# Altium footprint library altium_parts_templates_PCB.PcbLib: 93 footprints (part 3 of 6)
Each footprint in its own frame and in the unit in brackets; x right, y up, seen from the top. Pads: shape width x height; smd on the part's side, far side on the other; paste and mask are expansions set on the pad; w line width, h text height; cw(c..) or ccw(c..) is an arc to the next point about the centre after c.
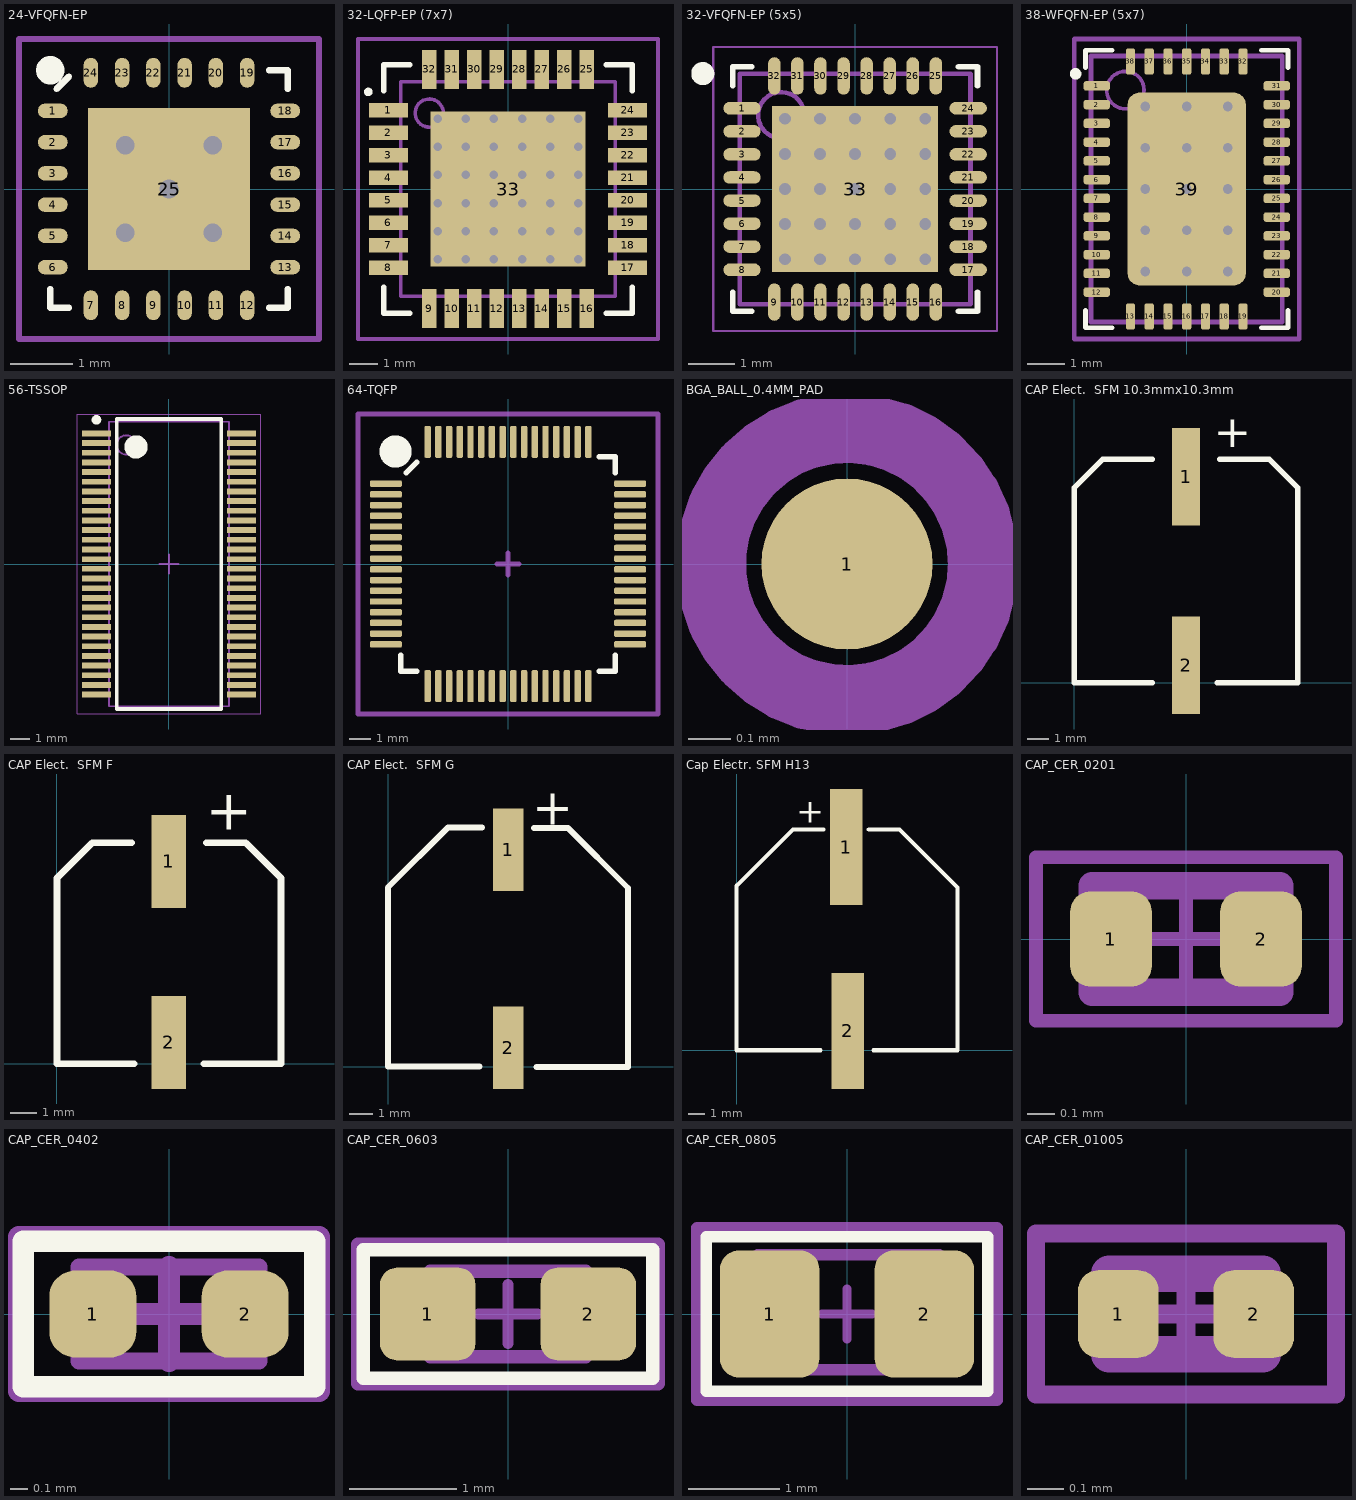
[diagram p2: the footprints below, top view; thin cyan lines are the x and y axes]

## 24-VFQFN-EP [mm] "24-VFQFN-EP"
pads (25):
  oval 0.48x0.23 smd: 1(-1.86,1.25) 2(-1.86,0.75) 3(-1.86,0.25) 4(-1.86,-0.25) 5(-1.86,-0.75) 6(-1.86,-1.25) 13(1.86,-1.25) 14(1.86,-0.75) 15(1.86,-0.25) 16(1.86,0.25) 17(1.86,0.75) 18(1.86,1.25)
  oval 0.23x0.48 smd: 7(-1.25,-1.86) 8(-0.75,-1.86) 9(-0.25,-1.86) 10(0.25,-1.86) 11(0.75,-1.86) 12(1.25,-1.86) 19(1.25,1.86) 20(0.75,1.86) 21(0.25,1.86) 22(-0.25,1.86) 23(-0.75,1.86) 24(-1.25,1.86)
  rect 2.6x2.6 smd: 25(0,0)
via 0,0 diameter 0.6 hole 0.3
via -0.7,0.7 diameter 0.6 hole 0.3
via -0.7,-0.7 diameter 0.6 hole 0.3
via 0.7,-0.7 diameter 0.6 hole 0.3
via 0.7,0.7 diameter 0.6 hole 0.3
Top Overlay:
  circle w0.254: c-1.9,1.9 r0.1
  lines w0.102: -1.9,-1.6 -1.9,-1.9 -1.6,-1.9 ; -1.8,1.6 -1.6,1.8 ; 1.6,-1.9 1.9,-1.9 1.9,-1.6 ; 1.6,1.9 1.9,1.9 1.9,1.6
Top Courtyard:
  lines w0.102: -0.3,0 0.3,0 ; 0,-0.3 0,0.3 ; -2.4,-2.4 2.4,-2.4 2.4,2.4 -2.4,2.4 -2.4,-2.4

## 32-LQFP-EP (7x7) [mm] "32-LQFP-EP, 32-HLQFP (7x7)"
height 2.45
pads (33):
  rect 1.4x0.5 smd paste-0.025 mask+0.07: 1(-4.25,2.8) 2(-4.25,2) 3(-4.25,1.2) 4(-4.25,0.4) 5(-4.25,-0.4) 6(-4.25,-1.2) 7(-4.25,-2) 8(-4.25,-2.8) 17(4.25,-2.8) 18(4.25,-2) 19(4.25,-1.2) 20(4.25,-0.4) 21(4.25,0.4) 22(4.25,1.2) 23(4.25,2) 24(4.25,2.8)
  rect 0.5x1.4 smd paste-0.025 mask+0.07: 9(-2.8,-4.25) 10(-2,-4.25) 11(-1.2,-4.25) 12(-0.4,-4.25) 13(0.4,-4.25) 14(1.2,-4.25) 15(2,-4.25) 16(2.8,-4.25) 25(2.8,4.25) 26(2,4.25) 27(1.2,4.25) 28(0.4,4.25) 29(-0.4,4.25) 30(-1.2,4.25) 31(-2,4.25) 32(-2.8,4.25)
  rect 5.5x5.5 smd paste-0.795 mask-0.795: 33(0,0)
via -2.5,-2.5 diameter 0.5 hole 0.3
via -1.5,-2.5 diameter 0.5 hole 0.3
via -0.5,-2.5 diameter 0.5 hole 0.3
via 0.5,-2.5 diameter 0.5 hole 0.3
via 1.5,-2.5 diameter 0.5 hole 0.3
via 2.5,-2.5 diameter 0.5 hole 0.3
via -2.5,-1.5 diameter 0.5 hole 0.3
via -1.5,-1.5 diameter 0.5 hole 0.3
via -0.5,-1.5 diameter 0.5 hole 0.3
via 0.5,-1.5 diameter 0.5 hole 0.3
via 1.5,-1.5 diameter 0.5 hole 0.3
via 2.5,-1.5 diameter 0.5 hole 0.3
via -2.5,-0.5 diameter 0.5 hole 0.3
via -1.5,-0.5 diameter 0.5 hole 0.3
via -0.5,-0.5 diameter 0.5 hole 0.3
via 0.5,-0.5 diameter 0.5 hole 0.3
via 1.5,-0.5 diameter 0.5 hole 0.3
via 2.5,-0.5 diameter 0.5 hole 0.3
via -2.5,0.5 diameter 0.5 hole 0.3
via -1.5,0.5 diameter 0.5 hole 0.3
via -0.5,0.5 diameter 0.5 hole 0.3
via 0.5,0.5 diameter 0.5 hole 0.3
via 1.5,0.5 diameter 0.5 hole 0.3
via 2.5,0.5 diameter 0.5 hole 0.3
via -2.5,1.5 diameter 0.5 hole 0.3
via -1.5,1.5 diameter 0.5 hole 0.3
via -0.5,1.5 diameter 0.5 hole 0.3
via 0.5,1.5 diameter 0.5 hole 0.3
via 1.5,1.5 diameter 0.5 hole 0.3
via 2.5,1.5 diameter 0.5 hole 0.3
via 2.5,2.5 diameter 0.5 hole 0.3
via 1.5,2.5 diameter 0.5 hole 0.3
via 0.5,2.5 diameter 0.5 hole 0.3
via -0.5,2.5 diameter 0.5 hole 0.3
via -1.5,2.5 diameter 0.5 hole 0.3
via -2.5,2.5 diameter 0.5 hole 0.3
Top Overlay:
  circle w0.152: c-4.969,3.452 r0.076
  lines w0.2: -4.417,-3.492 -4.417,-4.417 -3.492,-4.417 ; -4.417,3.492 -4.417,4.417 -3.492,4.417 ; 3.492,-4.417 4.417,-4.417 4.417,-3.492 ; 3.492,4.417 4.392,4.417 ; 4.417,3.492 4.417,4.417
Top Assembly Drawing:
  circle w0.127: c-2.8,2.7 r0.5
  lines w0.127: -3.81,-3.81 -3.81,3.81 3.81,3.81 3.81,-3.81 -3.81,-3.81
Top Courtyard:
  lines w0.127: -1.27,0 1.27,0 ; 0,-1.27 0,1.27 ; -5.334,-5.334 -5.334,5.334 5.334,5.334 5.334,-5.334 -5.334,-5.334
3D body: height 2.45, standoff 0, extent -3.81,-3.81 3.81,3.81

## 32-VFQFN-EP (5x5) [mm] "32-VFQFN-EP, 32-QFN (5x5)"
height 0.9
pads (33):
  oval 0.81x0.27 smd paste-0.025 mask+0.05: 1(-2.45,1.75) 2(-2.45,1.25) 3(-2.45,0.75) 4(-2.45,0.25) 5(-2.45,-0.25) 6(-2.45,-0.75) 7(-2.45,-1.25) 8(-2.45,-1.75) 17(2.45,-1.75) 18(2.45,-1.25) 19(2.45,-0.75) 20(2.45,-0.25) 21(2.45,0.25) 22(2.45,0.75) 23(2.45,1.25) 24(2.45,1.75)
  oval 0.27x0.81 smd paste-0.025 mask+0.05: 9(-1.75,-2.45) 10(-1.25,-2.45) 11(-0.75,-2.45) 12(-0.25,-2.45) 13(0.25,-2.45) 14(0.75,-2.45) 15(1.25,-2.45) 16(1.75,-2.45) 25(1.75,2.45) 26(1.25,2.45) 27(0.75,2.45) 28(0.25,2.45) 29(-0.25,2.45) 30(-0.75,2.45) 31(-1.25,2.45) 32(-1.75,2.45)
  rect 3.6x3.6 smd paste-5 mask+0.05: 33(0,0)
via -1.52,1.52 diameter 0.5 hole 0.254
via -0.76,1.52 diameter 0.5 hole 0.254
via 0,1.52 diameter 0.5 hole 0.254
via 0.76,1.52 diameter 0.5 hole 0.254
via 1.52,1.52 diameter 0.5 hole 0.254
via 1.52,0.76 diameter 0.5 hole 0.254
via 0.76,0.76 diameter 0.5 hole 0.254
via 0,0.76 diameter 0.5 hole 0.254
via -0.76,0.76 diameter 0.5 hole 0.254
via -1.52,0.76 diameter 0.5 hole 0.254
via 1.52,0 diameter 0.5 hole 0.254
via 0.76,0 diameter 0.5 hole 0.254
via 0,0 diameter 0.5 hole 0.254
via -0.76,0 diameter 0.5 hole 0.254
via -1.52,0 diameter 0.5 hole 0.254
via 1.52,-0.76 diameter 0.5 hole 0.254
via 0.76,-0.76 diameter 0.5 hole 0.254
via 0,-0.76 diameter 0.5 hole 0.254
via -0.76,-0.76 diameter 0.5 hole 0.254
via -1.52,-0.76 diameter 0.5 hole 0.254
via 1.52,-1.52 diameter 0.5 hole 0.254
via 0.76,-1.52 diameter 0.5 hole 0.254
via 0,-1.52 diameter 0.5 hole 0.254
via -0.76,-1.52 diameter 0.5 hole 0.254
via -1.52,-1.52 diameter 0.5 hole 0.254
Top Overlay:
  circle w0.25: c-3.3,2.5 r0.125
  lines w0.127: -2.65,-2.238 -2.65,-2.65 -2.238,-2.65 ; -2.65,2.238 -2.65,2.65 -2.238,2.65 ; 2.238,-2.65 2.65,-2.65 2.65,-2.238 ; 2.238,2.65 2.65,2.65 2.65,2.238
Top Paste:
  region: 0,0
  region: 0.2,-0.2 0.2,-1.8 1.8,-1.8 1.8,-0.2
  region: -1.8,-0.2 -1.8,-1.8 -0.2,-1.8 -0.2,-0.2
  region: -1.8,1.8 -1.8,0.2 -0.2,0.2 -0.2,1.8
  region: 0.2,1.8 0.2,0.2 1.8,0.2 1.8,1.8
Top Assembly Drawing:
  circle w0.1: c-1.6,1.6 r0.5
  lines w0.1: -2.5,-2.5 -2.5,2.5 2.5,2.5 2.5,-2.5 -2.5,-2.5
Top Courtyard:
  lines w0.05: -3.075,-3.075 -3.075,3.075 3.075,3.075 3.075,-3.075 -3.075,-3.075
  lines w0.1: -0.5,0 0.5,0 ; 0,-0.5 0,0.5
3D body "QFN127P600-8N.step": height 0.9, standoff 0, extent -2.53,-2.53 2.53,2.53

## 38-WFQFN-EP (5x7) [mm] "38-WFQFN-EP, 38-QFN (5x7)"
height 0.8
pads (39):
  rrect50% 0.7x0.25 smd paste+0 mask+0.05: 1(-2.4,2.75) 2(-2.4,2.25) 3(-2.4,1.75) 4(-2.4,1.25) 5(-2.4,0.75) 6(-2.4,0.25) 7(-2.4,-0.25) 8(-2.4,-0.75) 9(-2.4,-1.25) 10(-2.4,-1.75) 11(-2.4,-2.25) 12(-2.4,-2.75) 20(2.4,-2.75) 21(2.4,-2.25) 22(2.4,-1.75) 23(2.4,-1.25) 24(2.4,-0.75) 25(2.4,-0.25) 26(2.4,0.25) 27(2.4,0.75) 28(2.4,1.25) 29(2.4,1.75) 30(2.4,2.25) 31(2.4,2.75)
  rrect50% 0.25x0.7 smd paste+0 mask+0.05: 13(-1.5,-3.4) 14(-1,-3.4) 15(-0.5,-3.4) 16(0,-3.4) 17(0.5,-3.4) 18(1,-3.4) 19(1.5,-3.4) 32(1.5,3.4) 33(1,3.4) 34(0.5,3.4) 35(0,3.4) 36(-0.5,3.4) 37(-1,3.4) 38(-1.5,3.4)
  rrect20% 3.15x5.15 smd paste-10 mask+0.05: 39(0,0)
via 1.1,-2.2 diameter 0.508 hole 0.254
via 0,-2.2 diameter 0.508 hole 0.254
via -1.1,-2.2 diameter 0.508 hole 0.254
via 1.1,-1.1 diameter 0.508 hole 0.254
via 0,-1.1 diameter 0.508 hole 0.254
via -1.1,-1.1 diameter 0.508 hole 0.254
via 1.1,0 diameter 0.508 hole 0.254
via 0,0 diameter 0.508 hole 0.254
via -1.1,0 diameter 0.508 hole 0.254
via 1.1,1.1 diameter 0.508 hole 0.254
via 0,1.1 diameter 0.508 hole 0.254
via -1.1,1.1 diameter 0.508 hole 0.254
via 1.1,2.2 diameter 0.508 hole 0.254
via 0,2.2 diameter 0.508 hole 0.254
via -1.1,2.2 diameter 0.508 hole 0.254
Top Overlay:
  circle w0.152: c-2.963,3.071 r0.076
  lines w0.127: -2.7,-3.238 -2.7,-3.7 -1.988,-3.7 ; -2.7,3.238 -2.7,3.7 -1.988,3.7 ; 1.988,-3.7 2.7,-3.7 2.7,-3.238 ; 1.988,3.7 2.7,3.7 2.7,3.238
Top Paste:
  rectangle: -0.5,1.7 0.5,2.5
  rectangle: -0.5,0.6 0.5,1.6
  rectangle: -1.5,0.6 -0.6,1.6
  rectangle: -1.5,-0.5 -0.6,0.5
  rectangle: -1.5,-1.6 -0.6,-0.6
  rectangle: -0.5,-2.5 0.5,-1.7
  rectangle: -0.5,-0.5 0.5,0.5
  rectangle: -0.5,-1.6 0.5,-0.6
  region: 1.5,-0.6 0.6,-0.6 0.6,-1.6 1.5,-1.6
  region: 1.5,0.5 0.6,0.5 0.6,-0.5 1.5,-0.5
  region: 1.5,1.6 0.6,1.6 0.6,0.6 1.5,0.6
  region: -1.5,2.2 -1.5,2.26 -1.454,2.37 -1.37,2.454 -1.26,2.5 -1.2,2.5 -0.6,2.5 -0.6,1.7 -1.5,1.7
  region: 1.5,2.2 1.5,2.26 1.454,2.37 1.37,2.454 1.26,2.5 1.2,2.5 0.6,2.5 0.6,1.7 1.5,1.7
  region: 1.5,-2.2 1.5,-2.26 1.454,-2.37 1.37,-2.454 1.26,-2.5 1.2,-2.5 0.6,-2.5 0.6,-1.7 1.5,-1.7
  region: -1.5,-2.2 -1.5,-2.26 -1.454,-2.37 -1.37,-2.454 -1.26,-2.5 -1.2,-2.5 -0.6,-2.5 -0.6,-1.7 -1.5,-1.7
Top Assembly Drawing:
  circle w0.1: c-1.636,2.636 r0.5
  lines w0.127: -2.55,-3.55 2.55,-3.55 2.55,3.55 -2.55,3.55 -2.55,-3.55
Top Courtyard:
  lines w0.127: -0.5,0 0.5,0 ; 0,-0.5 0,0.5 ; -3,-4 3,-4 3,4 -3,4 -3,-4
3D body "ADC_LTC2499CUHF.step": height 0.8, standoff 0, extent -2.551,-3.551 2.551,3.551

## 56-TSSOP [mm] "56-TSSOP"
pads (56):
  rect 1.5x0.3 smd paste-0.025 mask+0.05: 1(-3.75,6.75) 2(-3.75,6.25) 3(-3.75,5.75) 4(-3.75,5.25) 5(-3.75,4.75) 6(-3.75,4.25) 7(-3.75,3.75) 8(-3.75,3.25) 9(-3.75,2.75) 10(-3.75,2.25) 11(-3.75,1.75) 12(-3.75,1.25) 13(-3.75,0.75) 14(-3.75,0.25) 15(-3.75,-0.25) 16(-3.75,-0.75) 17(-3.75,-1.25) 18(-3.75,-1.75) 19(-3.75,-2.25) 20(-3.75,-2.75) 21(-3.75,-3.25) 22(-3.75,-3.75) 23(-3.75,-4.25) 24(-3.75,-4.75) 25(-3.75,-5.25) 26(-3.75,-5.75) 27(-3.75,-6.25) 28(-3.75,-6.75) 29(3.75,-6.75) 30(3.75,-6.25) 31(3.75,-5.75) 32(3.75,-5.25) 33(3.75,-4.75) 34(3.75,-4.25) 35(3.75,-3.75) 36(3.75,-3.25) 37(3.75,-2.75) 38(3.75,-2.25) 39(3.75,-1.75) 40(3.75,-1.25) 41(3.75,-0.75) 42(3.75,-0.25) 43(3.75,0.25) 44(3.75,0.75) 45(3.75,1.25) 46(3.75,1.75) 47(3.75,2.25) 48(3.75,2.75) 49(3.75,3.25) 50(3.75,3.75) 51(3.75,4.25) 52(3.75,4.75) 53(3.75,5.25) 54(3.75,5.75) 55(3.75,6.25) 56(3.75,6.75)
Top Overlay:
  circle w0.25: c-3.75,7.45 r0.125
  circle w0.6: c-1.7,6.05 r0.3
  lines w0.2: -2.7,-7.5 -2.7,7.5 2.7,7.5 2.7,-7.5 -2.7,-7.5
Top Assembly Drawing:
  circle w0.1: c-2.2,6.15 r0.5
  lines w0.1: -3.1,-7.35 3.1,-7.35 3.1,7.35 -3.1,7.35 -3.1,-7.35
Top Courtyard:
  lines w0.05: -4.75,-7.75 -4.75,7.75 4.75,7.75 4.75,-7.75 -4.75,-7.75
  lines w0.1: -0.5,0 0.5,0 ; 0,-0.5 0,0.5
3D body: height 1.2, standoff 0.05, extent -3.1,-7.05 3.1,7.05

## 64-TQFP [mm] "65-TQFP"
pads (64):
  rrect50% 1.5x0.3 smd: 1(-5.7,3.75) 2(-5.7,3.25) 3(-5.7,2.75) 4(-5.7,2.25) 5(-5.7,1.75) 6(-5.7,1.25) 7(-5.7,0.75) 8(-5.7,0.25) 9(-5.7,-0.25) 10(-5.7,-0.75) 11(-5.7,-1.25) 12(-5.7,-1.75) 13(-5.7,-2.25) 14(-5.7,-2.75) 15(-5.7,-3.25) 16(-5.7,-3.75) 33(5.7,-3.75) 34(5.7,-3.25) 35(5.7,-2.75) 36(5.7,-2.25) 37(5.7,-1.75) 38(5.7,-1.25) 39(5.7,-0.75) 40(5.7,-0.25) 41(5.7,0.25) 42(5.7,0.75) 43(5.7,1.25) 44(5.7,1.75) 45(5.7,2.25) 46(5.7,2.75) 47(5.7,3.25) 48(5.7,3.75)
  rrect50% 0.3x1.5 smd: 17(-3.75,-5.7) 18(-3.25,-5.7) 19(-2.75,-5.7) 20(-2.25,-5.7) 21(-1.75,-5.7) 22(-1.25,-5.7) 23(-0.75,-5.7) 24(-0.25,-5.7) 25(0.25,-5.7) 26(0.75,-5.7) 27(1.25,-5.7) 28(1.75,-5.7) 29(2.25,-5.7) 30(2.75,-5.7) 31(3.25,-5.7) 32(3.75,-5.7) 49(3.75,5.7) 50(3.25,5.7) 51(2.75,5.7) 52(2.25,5.7) 53(1.75,5.7) 54(1.25,5.7) 55(0.75,5.7) 56(0.25,5.7) 57(-0.25,5.7) 58(-0.75,5.7) 59(-1.25,5.7) 60(-1.75,5.7) 61(-2.25,5.7) 62(-2.75,5.7) 63(-3.25,5.7) 64(-3.75,5.7)
Top Overlay:
  circle w1: c-5.25,5.25 r0.25
  lines w0.254: -5,-4.25 -5,-5 -4.25,-5 ; -4.75,4.25 -4.25,4.75 ; 4.25,-5 5,-5 5,-4.25 ; 4.25,5 5,5 5,4.25
Top Courtyard:
  lines w0.254: -0.5,0 0.5,0 ; 0,-0.5 0,0.5 ; -7,-7 -7,7 7,7 7,-7 -7,-7

## BGA_BALL_0.4MM_PAD [mm]
pads (1):
  round 0.4 smd mask+0.05: 1(0,0)
Top Assembly Drawing:
  circle w0.127: c0,0 r0.3
Top Courtyard:
  circle w0.1: c0,0 r0.351
  lines w0.127: -0.125,0 0.125,0 ; 0,-0.125 0,0.125
3D body: height 0.5, standoff -0.1, extent -0.3,-0.298 0.3,0.298

## CAP Elect.  SFM 10.3mmx10.3mm [mm]
height 10.2
pads (2):
  rect 1.3x4.5 smd: 1(5.15,9.5) 2(5.15,0.8)
Top Overlay:
  lines w0.254: 3.6,0 0,0 0,9 1.3,10.3 3.6,10.3 ; 6.6,0 10.3,0 10.3,9 9,10.3 6.7,10.3
  text "+" at 6.425,10.875 h1.52
3D body: height 3.5, standoff 0, extent 0,0 10.3,10.3
3D body: height 13.7, standoff 3.5, extent 0.15,0.15 10.111,10.13

## CAP Elect.  SFM F [mm]
height 10.49
pads (2):
  rect 1.3x3.5 smd: 1(4.2,7.6) 2(4.2,0.8)
Top Overlay:
  lines w0.254: 2.8,8.3 1.325,8.3 0,6.975 0,0 2.9,0 ; 5.525,0 8.425,0 8.425,6.975 7.1,8.3 5.625,8.3
  text "+" at 5.6,8.8 h1.52
3D body "User Library-AL_EL_cap_8mmx10mm.STEP": height 10.5, standoff 0, extent -0.075,-0.675 8.425,9.025

## CAP Elect.  SFM G [mm]
height 12.2
pads (2):
  rect 1.3x3.5 smd: 1(5.1,9.2) 2(5.1,0.8)
Top Overlay:
  lines w0.254: 3.875,0 0,0 0,7.6 2.55,10.15 3.975,10.15 ; 6.2,10.125 7.625,10.125 10.175,7.575 10.175,-0.025 6.3,-0.025
  text "+" at 6.125,10.25 h1.52
3D body "SW3dPS-APXA4R0ARA122MJC2G CAP United Chemi-Con.STEP": height 11.94, standoff 0.09, extent 0,0 10.16,10.16

## Cap Electr. SFM H13 [mm] "Panasonic H13 SFM Cap Package"
height 0.9
pads (2):
  rect 2x7.2 smd: 1(6.8,12.6) 2(6.9,1.2)
Top Overlay:
  lines w0.254: 5.2,0 0,0 0,10.2 3.5,13.7 5.4,13.7 ; 8.2,13.7 10.1,13.7 13.7,10.1 13.7,0 8.5,0
  text "+" at 3.7,14.1 h1.52
3D body: height 2, standoff 0, extent 0,0 13.7,13.7
3D body: height 16.5, standoff 2, extent 0.451,0.4 13.4,13.374

## CAP_CER_0201 [mm] "Chip Capacitor, 2-Leads, Body 0,60x0,30mm, IPC Medium Density"
height 0.39
pads (2):
  rrect50% 0.3x0.35 smd paste+0 mask+0.02: 1(-0.275,0) 2(0.275,0)
Top Assembly Drawing:
  lines w0.1: -0.345,-0.195 -0.345,0.195 0.345,0.195 0.345,-0.195 -0.345,-0.195
Top Courtyard:
  lines w0.05: -0.195,0 0.195,0 ; 0,-0.195 0,0.195 ; -0.55,-0.3 0.55,-0.3 0.55,0.3 -0.55,0.3 -0.55,-0.3
3D body "CAPC0603X04N.step": height 0.39, standoff 0, extent -0.345,-0.195 0.345,0.195

## CAP_CER_0402 [mil] "Ceramic Capacitor - 0402"
height 23.62
pads (2):
  rrect60% 20x20 smd paste+0 mask+1.97: 1(-17.5,0) 2(17.5,0)
Top Overlay:
  lines w5: -33.46,-16.73 33.46,-16.73 33.46,16.73 -33.46,16.73 -33.46,-16.73
Top Assembly Drawing:
  lines w3.94: -20.67,-10.83 20.67,-10.83 20.67,10.83 -20.67,10.83 -20.67,-10.83
Top Courtyard:
  lines w5: -10.83,0 10.83,0 ; 0,-10.83 0,10.83 ; -34.45,-17.72 -34.45,17.72 34.45,17.72 34.45,-17.72 -34.45,-17.72
3D body "Cap0402.step": height 19.68, standoff 0, extent -19.37,-9.69 20,10

## CAP_CER_0603 [mil] "Ceramic Capacitor - 0603"
height 31.5
pads (2):
  rrect35% 35x34 smd paste+0 mask+1.97: 1(-29.5,0) 2(29.5,0)
Top Overlay:
  lines w5: -53.15,-23.62 53.15,-23.62 53.15,23.62 -53.15,23.62 -53.15,-23.62
Top Assembly Drawing:
  lines w5: -28.54,-15.75 28.54,-15.75 28.54,15.75 -28.54,15.75 -28.54,-15.75
Top Courtyard:
  lines w3.94: -10.83,0 10.83,0 ; 0,-10.83 0,10.83
  lines w5: -55.12,-25.59 55.12,-25.59 55.12,25.59 -55.12,25.59 -55.12,-25.59
3D body "Cap0603.step": height 35.43, standoff 0, extent -31.5,-15.75 31.5,15.75

## CAP_CER_0805 [mil] "Ceramic Capacitor - 0805"
height 49.21
pads (2):
  rrect37% 43x55 smd paste+0 mask+1.97: 1(-33.5,0) 2(33.5,0)
Top Overlay:
  lines w5: -61.02,-33.46 61.02,-33.46 61.02,33.46 -61.02,33.46 -61.02,-33.46
Top Assembly Drawing:
  lines w5: -38.74,-24.21 -38.74,25.59 40,25.59 40,-24.21 -38.74,-24.21
Top Courtyard:
  lines w3.94: -10.83,0 10.83,0 ; 0,-10.83 0,10.83
  lines w5: -64.96,-37.4 64.96,-37.4 64.96,37.4 -64.96,37.4 -64.96,-37.4
3D body "Cap0805.step": height 49.21, standoff 0, extent -38.74,-24.21 40,25

## CAP_CER_01005 [mm] "Chip Capacitor, 2-Leads, Body 0,40x0,20mm, IPC High Density"
height 0.22
pads (2):
  rrect50% 0.22x0.24 smd paste+0 mask+0.02: 1(-0.185,0) 2(0.185,0)
Top Assembly Drawing:
  lines w0.1: -0.21,-0.11 -0.21,0.11 0.21,0.11 0.21,-0.11 -0.21,-0.11
Top Courtyard:
  lines w0.05: -0.41,-0.22 0.41,-0.22 0.41,0.22 -0.41,0.22 -0.41,-0.22
  lines w0.051: -0.11,0 0.11,0 ; 0,-0.11 0,0.11
3D body "CAPC0402X02L.step": height 0.22, standoff 0, extent -0.21,-0.11 0.21,0.11